# Altium schematic symbol library lib_datalogger.SchLib: 1246 symbols (part 11 of 16) (continued)
## CMP-018-000010-1 (continued)
RES 180 OHM 1/8W 5% 0805 SMD; Manufacturer Part Number: ERJ-6GEYJ181V; Power (Watts): 0.125W, 1/8W; Resistance (Ohms): 180; Temperature Coefficient: ±200ppm/°C; RoHS: RoHS Compliant; Source: mits.SchLib; Operating Temperature: -55°C ~ 155°C; ComponentLink1URL: http://industrial.panasonic.com/www-cgi/jvcr13pz.cgi?E+PZ+3+AOA0001+ERJ6GEYJ181V+7+WW; Stock 1: 114196; Part Status: Active; Pricing 1: 1=0.1, 10=0.025, 25=0.018, 50=0.0136, 100=0.01, 250=0.00764, 500=0.00612, 1000=0.00451 (USD); Category: Resistors; Height - Seated (Max): 0.028" (0.70mm); Design Item ID: RES 180R 1/8W 5% 0805 SMD; Failure Rate: -; ComponentLink1Description: http://industrial.panasonic.com/www-cgi/jvcr13pz.cgi?E+PZ+3+AOA0001+ERJ6GEYJ181V+7+WW; Supplier Device Package: 0805; Size / Dimension: 0.079" L x 0.049" W (2.00mm x 1.25mm); Package / Case: 0805 (2012 Metric); Features: Automotive AEC-Q200
footprint CR1608-0603 (Chip Resistor; Body 1.6 x 0.8 mm (LxW typ))
footprint CR2012-0805 (Chip Capacitor)
pins: 1, 2

## CMP-018-000011-1
designator R?, comment RES 1k5 1/10W 1% 0402 SMD  Manufacturer: Panasonic Electronic Components
RES SMD 1.5K OHM 1% 1/10W 0402; Part#: ERJ-2RKF1501X; eVendor#: P1.50KLCT-ND; eVendor: Digi-Key; eVendorPrice: 0,10; MSRP: 0,00383; Datasheet: http://industrial.panasonic.com/www-cgi/jvcr13pz.cgi?E+PZ+3+AOA0002+ERJ2RKF1501X+7+WW; Design Item ID: RES 1k5 1/10W 1% 0402 SMD; MOQ: 5000; Source: mits.SchLib
footprint CR1608-0603 (Chip Resistor; Body 1.6 x 0.8 mm (LxW typ))
footprint CR1005-0402
pins: 1, 2

## CMP-018-000013-1
designator CON?, comment RES 270R 1% 1/8W 0805 SMD  Composition: Thick Film  Manufacturer: Yageo  Tolerance: ±1%  Packaging: Cut Tape (CT)
RES SMD 270 OHM 1% 1/8W 0805; Manufacturer Part Number: RC0805FR-07270RL; Resistance (Ohms): 270; Temperature Coefficient: ±100ppm/°C; Power (Watts): 0.125W, 1/8W; Stock 1: 182204; RoHS: RoHS Compliant; Source: mits.SchLib; Package / Case: 0805 (2012 Metric); Design Item ID: RES 270R 1% 1/8W 0805 SMD; Number of Terminations: 2; Size / Dimension: 0.079" L x 0.049" W (2.00mm x 1.25mm); Supplier Device Package: 0805; ComponentLink1URL: http://www.yageo.com/documents/recent/PYu-RC_Group_51_RoHS_L_04.pdf; Operating Temperature: -55°C ~ 155°C; Category: Resistors; ComponentLink1Description: http://www.yageo.com/documents/recent/PYu-RC_Group_51_RoHS_L_04.pdf; Features: Moisture Resistant; Height: 0.024" (0.60mm); Pricing 1: 1=0.1, 10=0.021, 25=0.0152, 100=0.0084, 250=0.00644, 500=0.00514, 1000=0.00379, 2500=0.00329 (USD)
footprint CR2012-0805 (Chip Capacitor)
pins: 1, 2, 3, 4, 5, 6

## CMP-018-000014-1
designator R?, comment RES 270R 5% 1/4W 1206 SMD  Tolerance: ±5%  Composition: Thick Film  Manufacturer: Panasonic Electronic Components  Packaging: Cut Tape (CT)
RES SMD 270 OHM 5% 1/4W 1206; Manufacturer Part Number: ERJ-8GEYJ271V; Resistance (Ohms): 270; Power (Watts): 0.25W, 1/4W; Temperature Coefficient: ±200ppm/°C; Supplier Device Package: 1206; Number of Terminations: 2; Height: 0.028" (0.70mm); Design Item ID: RES 270R 5% 1/4W 1206 SMD; ComponentLink1URL: http://industrial.panasonic.com/www-cgi/jvcr13pz.cgi?E+PZ+3+AOA0001+ERJ8GEYJ271V+7+WW; Pricing 1: 1=0.1, 50=0.0212, 100=0.0156, 250=0.01188, 500=0.0095, 1000=0.007 (USD); Part Status: Active; RoHS: RoHS Compliant; Package / Case: 1206 (3216 Metric); Stock 1: 108729; Category: Resistors; Source: mits.SchLib; Size / Dimension: 0.126" L x 0.063" W (3.20mm x 1.60mm); Operating Temperature: -55°C ~ 155°C; Features: Automotive AEC-Q200; ComponentLink1Description: http://industrial.panasonic.com/www-cgi/jvcr13pz.cgi?E+PZ+3+AOA0001+ERJ8GEYJ271V+7+WW
footprint CR1608-0603 (Chip Resistor; Body 1.6 x 0.8 mm (LxW typ))
footprint CR3216-1206 (Chip Capacitor; Body 3.2 x 1.6 mm (LxW typ))
pins: 1, 2

## CMP-018-000015-2
designator R?, comment RES 2K7 OHM 1% 1/10W 0603  Composition: Thick Film  Packaging: Cut Tape (CT)  Tolerance: ±1%  Manufacturer: Yageo
RES SMD 2.7K OHM 1% 1/10W 0603; Manufacturer Part Number: RC0603FR-072K7L; Power (Watts): 0.1W, 1/10W; Temperature Coefficient: ±100ppm/°C; Source: mits.SchLib; Stock 1: 192813; Part Status: Active; Features: Moisture Resistant; RoHS: RoHS Compliant; ComponentLink1URL: http://www.yageo.com/NewPortal/yageodocoutput?fileName=/pdf/R-Chip/PYu-RC_Group_51_RoHS_L_4.pdf; Height - Seated (Max): 0.022" (0.55mm); Pricing 1: 1=0.1, 10=0.013, 25=0.0092, 50=0.007, 100=0.0052, 250=0.00396, 500=0.00316, 1000=0.00233 (USD); Failure Rate: -; Supplier Device Package: 0603; Category: Resistors; Resistance (Ohms): 2.7k; Size / Dimension: 0.063" L x 0.031" W (1.60mm x 0.80mm); Number of Terminations: 2; Design Item ID: RES 2K7 OHM 1% 1/10W 0603; Package / Case: 0603 (1608 Metric); Operating Temperature: -55°C ~ 155°C; ComponentLink1Description: http://www.yageo.com/NewPortal/yageodocoutput?fileName=/pdf/R-Chip/PYu-RC_Group_51_RoHS_L_4.pdf
footprint CR1608-0603 (Chip Resistor; Body 1.6 x 0.8 mm (LxW typ))
footprint CR1608-0603 (Chip Resistor; Body 1.6 x 0.8 mm (LxW typ))
pins: 1, 2

## CMP-018-000016-1
designator R?, comment RES 330K 1% 1/8W 0805 SMD  RoHS Compliant: Yes  Manufacturer: Panasonic  Max Operating Temperature: 155°C  Case/Package: 0805  Min Operating Temperature: -55°C  Resistance: 330kR  Package Quantity: 1  Packaging: Tape and Reel  Tolerance: 1%  Voltage Rating: 150V
SMD Chip Resistor, 0805 [2012 Metric], 330 kohm, ERJ6EN Series, 150 V, Thick Film, 125 mW; Manufacturer Part Number: ERJP06F3303V; Power Rating: 500mW; Temperature Coefficient: 100ppm/°C; Max Power Dissipation: 125mW; REACH SVHC: No SVHC; ComponentLink17URL: https://datasheet.ciiva.com/17206/aoa0000ce2-17206265.pdf?src-supplier=Avnet+Europe; Military Standard: Not; Source: mits.SchLib; ComponentLink14URL: https://datasheet.ciiva.com/16761/70260748-16761642.pdf?src-supplier=Allied+Electronics; ComponentLink13Description: https://datasheet.ciiva.com/24026/aoa0000ce2-24026247.pdf?src-supplier=Mouser; ComponentLink2Description: https://datasheet.ciiva.com/5915/1674679-5915439.pdf?src-supplier=Farnell; ComponentLink6URL: https://datasheet.ciiva.com/11821/0900766b80f80784-11821637.pdf?src-supplier=RSComponents; Stock 1: 4880; ComponentLink7URL: https://datasheet.ciiva.com/5915/426256-5915341.pdf?src-supplier=Farnell; Pricing 2: 1=0,10000, 10=0,07500, 100=0,02880, 1000=0,01265, 2500=0,01092 (USD); Series: ERJ-P06; Resistance Tolerance: 1%; Length: 2mm; ComponentLink15Description: https://datasheet.ciiva.com/16765/70260748-16765294.pdf?src-supplier=Allied+Electronics; ComponentLink16URL: https://datasheet.ciiva.com/9183/aoa0000ce2-9183029.pdf?src-supplier=Avnet; Width: 1.2mm; ComponentLink14Description: https://datasheet.ciiva.com/16761/70260748-16761642.pdf?src-supplier=Allied+Electronics; ComponentLink6Description: https://datasheet.ciiva.com/11821/0900766b80f80784-11821637.pdf?src-supplier=RSComponents; ComponentLink15URL: https://datasheet.ciiva.com/16765/70260748-16765294.pdf?src-supplier=Allied+Electronics; Category: Chip SMD Resistors; ComponentLink12URL: https://datasheet.ciiva.com/46420/1678782-46420183.pdf?src-supplier=Element14; ComponentLink7Description: https://datasheet.ciiva.com/5915/426256-5915341.pdf?src-supplier=Farnell; ComponentLink9URL: https://datasheet.ciiva.com/7836/426256-7836824.pdf?src-supplier=Element14; Case Code (Metric): 2012; Pricing 1: 10=0,05250, 100=0,04060, 300=0,03840, 1000=0,03620, 5000=0,03530, 10000=0,03480, 10=0,05070, 100=0,03920, 300=0,03710, 1000=0,03500, 5000=0,03410, 10000=0,03360, 10=0,26530, 100=0,20500, 300=0,19400, 1000=0,18290, 5000=0,17840, 10000=0,17580, 10=0,25190, 100=0,19460, 300=0,18420, 1000=0,17370, 5000=0,16940, 10000=0,16690, 10=0,03390, 100=0,02620, 300=0,02480, 1000=0,02340, 5000=0,02280, 10000=0,02240, 10=0,02940, 100=0,02280, 300=0,02150, 1000=0,02030, 5000=0,01980, 10000=0,01950, 10=0,31740, 100=0,24530, 300=0,23210, 1000=0,21890, 5000=0,21340, 10000=0,21030, 10=4,42890, 100=3,42180, 300=3,23770, 1000=3,05360, 5000=2,97780, 10000=2,93450, 10=0,16760, 100=0,12950, 300=0,12260, 1000=0,11560, 5000=0,11270, 10000=0,11110, 10=3,06680, 100=2,36940, 300=2,24200, 1000=2,11450, 5000=2,06200, 10000=2,03200, 10=0,34300, 100=0,26500, 300=0,25080, 1000=0,23650, 5000=0,23060, 10000=0,22730, 10=0,05430, 100=0,04190, 300=0,03970, 1000=0,03740, 5000=0,03650, 10000=0,03590, 10=0,04090, 100=0,03160, 300=0,02990, 1000=0,02820, 5000=0,02750, 10000=0,02710 (AUD); Height: 0.6mm; ComponentLink12Description: https://datasheet.ciiva.com/46420/1678782-46420183.pdf?src-supplier=Element14; Design Item ID: RES 330K 1% 1/8W 0805 SMD; ComponentLink4Description: https://datasheet.ciiva.com/17206/aoa0000ce4-17206277.pdf?src-supplier=Avnet+Europe; ComponentLink3URL: https://datasheet.ciiva.com/24160/aoa0000ce4-64075-24160351.pdf?src-supplier=Mouser; ComponentLink10URL: https://datasheet.ciiva.com/22673/1678782-22673294.pdf?src-supplier=Element14; ComponentLink8Description: https://datasheet.ciiva.com/7836/426256-7836539.pdf?src-supplier=Element14; Weight: 0.000194oz; ComponentLink1URL: https://datasheet.ciiva.com/11817/0900766b812cb812-11817202.pdf?src-supplier=RSComponents; Contact Plating: Tin; ComponentLink3Description: https://datasheet.ciiva.com/24160/aoa0000ce4-64075-24160351.pdf?src-supplier=Mouser; RoHS: Yes; Technology: THICK FILM; ComponentLink16Description: https://datasheet.ciiva.com/9183/aoa0000ce2-9183029.pdf?src-supplier=Avnet; ComponentLink8URL: https://datasheet.ciiva.com/7836/426256-7836539.pdf?src-supplier=Element14; ComponentLink2URL: https://datasheet.ciiva.com/5915/1674679-5915439.pdf?src-supplier=Farnell; Stock 2: 35692; ComponentLink13URL: https://datasheet.ciiva.com/24026/aoa0000ce2-24026247.pdf?src-supplier=Mouser; Stock 3: 48300; ComponentLink4URL: https://datasheet.ciiva.com/17206/aoa0000ce4-17206277.pdf?src-supplier=Avnet+Europe; ComponentLink1Description: https://datasheet.ciiva.com/11817/0900766b812cb812-11817202.pdf?src-supplier=RSComponents; Construction: Rectangular; Number of Terminations: 2; Resistor Type: Thick Film; ComponentLink5URL: https://datasheet.ciiva.com/48426/erjp-series-eng-tds-48426811.pdf?src-supplier=Distrelec; ComponentLink17Description: https://datasheet.ciiva.com/17206/aoa0000ce2-17206265.pdf?src-supplier=Avnet+Europe; ComponentLink10Description: https://datasheet.ciiva.com/22673/1678782-22673294.pdf?src-supplier=Element14; Voltage Rating (DC): 150V; ComponentLink11Description: https://datasheet.ciiva.com/22687/1678782-22687438.pdf?src-supplier=Element14; Features: Automotive AEC-Q200; Radiation Hardening: No; Pricing 3: 100=0,00450, 1000=0,00350, 3000=0,00320, 10000=0,00310, 50000=0,00300, 100000=0,00300, 100=0,00430, 1000=0,00330, 3000=0,00310, 10000=0,00300, 50000=0,00290, 100000=0,00290, 100=0,02270, 1000=0,01750, 3000=0,01620, 10000=0,01560, 50000=0,01490, 100000=0,01490, 100=0,02160, 1000=0,01660, 3000=0,01540, 10000=0,01480, 50000=0,01420, 100000=0,01420, 100=0,00290, 1000=0,00220, 3000=0,00210, 10000=0,00200, 50000=0,00190, 100000=0,00190, 100=0,00250, 1000=0,00190, 3000=0,00180, 10000=0,00170, 50000=0,00170, 100000=0,00170, 100=0,02720, 1000=0,02100, 3000=0,01940, 10000=0,01860, 50000=0,01790, 100000=0,01790, 100=0,37900, 1000=0,29240, 3000=0,27070, 10000=0,25990, 50000=0,24910, 100000=0,24910, 100=0,01430, 1000=0,01110, 3000=0,01020, 10000=0,00980, 50000=0,00940, 100000=0,00940, 100=0,26240, 1000=0,20250, 3000=0,18750, 10000=0,18000, 50000=0,17250, 100000=0,17250, 100=0,02940, 1000=0,02260, 3000=0,02100, 10000=0,02010, 50000=0,01930, 100000=0,01930, 100=0,00460, 1000=0,00360, 3000=0,00330, 10000=0,00320, 50000=0,00310, 100000=0,00310, 100=0,00350, 1000=0,00270, 3000=0,00250, 10000=0,00240, 50000=0,00230, 100000=0,00230 (AUD); Mount: Surface Mount; ComponentLink9Description: https://datasheet.ciiva.com/7836/426256-7836824.pdf?src-supplier=Element14; ComponentLink11URL: https://datasheet.ciiva.com/22687/1678782-22687438.pdf?src-supplier=Element14; Case Code (Imperial): 0805; Termination: SMD/SMT; Number of Pins: 2; Depth: 1.25mm; ComponentLink5Description: https://datasheet.ciiva.com/48426/erjp-series-eng-tds-48426811.pdf?src-supplier=Distrelec
footprint CR1608-0603 (Chip Resistor; Body 1.6 x 0.8 mm (LxW typ))
footprint CR2012-0805 (Chip Capacitor)
pins: 1, 2

## CMP-018-000017-1
designator R?, comment RES 49R9 1/4W 1% 1206 SMD  Packaging: Cut Tape (CT)  Manufacturer: Panasonic Electronic Components  Tolerance: ±1%  Composition: Thick Film
RES SMD 49.9 OHM 1% 1/4W 1206; Manufacturer Part Number: ERJ-8ENF49R9V; Resistance (Ohms): 49.9; Temperature Coefficient: ±100ppm/°C; Power (Watts): 0.25W, 1/4W; Height - Seated (Max): 0.028" (0.70mm); Source: mits.SchLib; Stock 1: 252764; ComponentLink1Description: https://industrial.panasonic.com/cdbs/www-data/pdf/RDA0000/AOA0000C283.pdf; Operating Temperature: -55°C ~ 155°C; Features: Automotive AEC-Q200; Supplier Device Package: 1206; RoHS: RoHS Compliant; ComponentLink1URL: https://industrial.panasonic.com/cdbs/www-data/pdf/RDA0000/AOA0000C283.pdf; Size / Dimension: 0.126" L x 0.063" W (3.20mm x 1.60mm); Package / Case: 1206 (3216 Metric); Number of Terminations: 2; Pricing 1: 1=0.1, 10=0.046, 25=0.0336, 50=0.0256, 100=0.0189, 250=0.0144, 500=0.01152, 1000=0.00848 (USD); Failure Rate: -; Design Item ID: RES 49R9 1/4W 1% 1206 SMD; Category: Resistors; Part Status: Active
footprint CR1608-0603 (Chip Resistor; Body 1.6 x 0.8 mm (LxW typ))
footprint CR3216-1206 (Chip Capacitor; Body 3.2 x 1.6 mm (LxW typ))
pins: 1, 2

## CMP-018-000018-1
designator R?, comment RES 4K7 0.25W 5% 0603 SMD  Resistance: 4.7kR  Case/Package: 0603  Max Operating Temperature: 155°C  Voltage Rating: 75V  Packaging: Tape and Reel  Package Quantity: 1  Tolerance: 5%  Min Operating Temperature: -55°C  RoHS Compliant: Yes
RES SMD 4.7K OHM 5% 0.25W 0603; Max Power Dissipation: 250mW; Voltage Rating (DC): 50V; Temperature Coefficient: 200ppm/°C; Number of Terminations: 2; Category: Chip SMD Resistors; ComponentLink7Description: https://datasheet.ciiva.com/26179/chip-resistor-150112-1-26179192.pdf?src-supplier=Digi-Key; Construction: Rectangular; ComponentLink4URL: https://datasheet.ciiva.com/2472/crcwhpe3-2472117.pdf?src-supplier=Digi-Key; Stock 1: 26974; Weight: 7.1E-05oz; Series: CRCW-HP; Radiation Hardening: No; Lead Free: Lead Free; ComponentLink2Description: https://datasheet.ciiva.com/5544/crcwhpe3-46056-5544495.pdf?src-supplier=Mouser; Case Code (Metric): 1608; Design Item ID: RES 4K7 0.25W 5% 0603 SMD; ComponentLink6Description: https://datasheet.ciiva.com/2472/crcwhpe3-2472119.pdf?src-supplier=Digi-Key; Pricing 1: 1=0,16000, 10=0,13500, 100=0,05290, 1000=0,02215, 2500=0,02030 (USD); ComponentLink3Description: https://datasheet.ciiva.com/9071/crcwhpe3-9071355.pdf?src-supplier=Avnet; Stock 2: 165000; ComponentLink9URL: https://datasheet.ciiva.com/26179/chip-resistor-150112-1-26179209.pdf?src-supplier=Digi-Key; ComponentLink1URL: https://datasheet.ciiva.com/48527/crcwhpe3-48527015.pdf?src-supplier=Avnet; Height: 0.022inch; ComponentLink4Description: https://datasheet.ciiva.com/2472/crcwhpe3-2472117.pdf?src-supplier=Digi-Key; Width: 0.033inch; Features: Automotive AEC-Q200; Contact Plating: Tin; ComponentLink5URL: https://datasheet.ciiva.com/2472/crcwhpe3-2472118.pdf?src-supplier=Digi-Key; ComponentLink1Description: https://datasheet.ciiva.com/48527/crcwhpe3-48527015.pdf?src-supplier=Avnet; ComponentLink5Description: https://datasheet.ciiva.com/2472/crcwhpe3-2472118.pdf?src-supplier=Digi-Key; ComponentLink6URL: https://datasheet.ciiva.com/2472/crcwhpe3-2472119.pdf?src-supplier=Digi-Key; ComponentLink2URL: https://datasheet.ciiva.com/5544/crcwhpe3-46056-5544495.pdf?src-supplier=Mouser; Case Code (Imperial): 0603; ComponentLink3URL: https://datasheet.ciiva.com/9071/crcwhpe3-9071355.pdf?src-supplier=Avnet; ComponentLink7URL: https://datasheet.ciiva.com/26179/chip-resistor-150112-1-26179192.pdf?src-supplier=Digi-Key; Resistor Type: Thick Film; Power Rating: 250mW; Military Standard: Not; Depth: 0.8mm; Source: mits.SchLib; ComponentLink9Description: https://datasheet.ciiva.com/26179/chip-resistor-150112-1-26179209.pdf?src-supplier=Digi-Key; ComponentLink8Description: https://datasheet.ciiva.com/26179/chip-resistor-150112-1-26179179.pdf?src-supplier=Digi-Key; Pricing 2: 5000=0,01114 (USD); ComponentLink8URL: https://datasheet.ciiva.com/26179/chip-resistor-150112-1-26179179.pdf?src-supplier=Digi-Key; Length: 0.063inch
footprint CR1608-0603 (Chip Resistor; Body 1.6 x 0.8 mm (LxW typ))
footprint CR1608-0603 (Chip Resistor; Body 1.6 x 0.8 mm (LxW typ))
pins: 1, 2

## CMP-018-000019-1
designator R?, comment RES 120R 5% 1/10W 0603 SMD  Packaging: Cut Tape (CT)  Composition: Thick Film  Manufacturer: Yageo  Tolerance: ±5%
RES SMD 120 OHM 5% 1/10W 0603; Manufacturer Part Number: RC0603JR-07120RL; Power (Watts): 0.1W, 1/10W; Temperature Coefficient: ±100ppm/°C; Resistance (Ohms): 120; Number of Terminations: 2; Package / Case: 0603 (1608 Metric); Failure Rate: -; RoHS: RoHS Compliant; Pricing 1: 1=0.1, 10=0.01, 25=0.0072, 50=0.0054, 100=0.004, 250=0.00308, 500=0.00244, 1000=0.0018 (USD); ComponentLink1Description: http://www.yageo.com/NewPortal/yageodocoutput?fileName=/pdf/R-Chip/PYu-RC_Group_51_RoHS_L_4.pdf; Size / Dimension: 0.063" L x 0.031" W (1.60mm x 0.80mm); ComponentLink1URL: http://www.yageo.com/NewPortal/yageodocoutput?fileName=/pdf/R-Chip/PYu-RC_Group_51_RoHS_L_4.pdf; Features: Moisture Resistant; Stock 1: 753960; Operating Temperature: -55°C ~ 155°C; Part Status: Active; Category: Resistors; Supplier Device Package: 0603; Source: mits.SchLib; Design Item ID: RES 120R 5% 1/10W 0603 SMD; Height - Seated (Max): 0.022" (0.55mm)
footprint CR1608-0603 (Chip Resistor; Body 1.6 x 0.8 mm (LxW typ))
footprint CR1608-0603 (Chip Resistor; Body 1.6 x 0.8 mm (LxW typ))
pins: 1, 2

## CMP-018-000020-1
designator R?, comment RES 27K 1% 1/8W 0805 SMD_1  Manufacturer: KOA Speer  Composition: Thick Film  Max Operating Temperature: 155°C  Packaging: Tape and Reel  Min Operating Temperature: -55°C  Resistance: 27kR  Case/Package: 0805  Package Quantity: 5000  Voltage Rating: 150V  Tolerance: 1%
RES SMD 27K OHM 1% 1/8W 0805; Manufacturer Part Number: RK73H2ATTD2702F; Temperature Coefficient: 100ppm/°C; Power Rating: 125mW; Case Code (Metric): 2012; ComponentLink2URL: https://datasheet.ciiva.com/7866/549017-7866749.pdf?src-supplier=Element14; ComponentLink1Description: http://www.yageo.com/documents/recent/PYu-RC_Group_51_RoHS_L_04.pdf; Military Standard: Not; Pricing 1: 1=0,10000, 10=0,03300, 100=0,01360, 1000=0,00612, 2500=0,00531 (USD); Source: mits.SchLib; Design Item ID: RES 27K 1% 1/8W 0805 SMD_1; Length: 2mm; Lead Free: Lead Free; Depth: 1.25mm; RoHS: Yes; ComponentLink2Description: https://datasheet.ciiva.com/7866/549017-7866749.pdf?src-supplier=Element14; Height: 0.5mm; Stock 1: 25750; Case Code (Imperial): 0805; Category: Chip SMD Resistors; Width: 1.25mm; Number of Pins: 2; Termination: SMD/SMT; ComponentLink1URL: http://www.yageo.com/documents/recent/PYu-RC_Group_51_RoHS_L_04.pdf
footprint CR1608-0603 (Chip Resistor; Body 1.6 x 0.8 mm (LxW typ))
footprint CR2012-0805 (Chip Capacitor)
pins: 1, 2

## CMP-018-000021-1
designator R?, comment RES 2K OHM 0.1% 1/10W 0603  Case/Package: 0603  Min Operating Temperature: -55°C  Voltage Rating: 75V  Packaging: Tape and Reel  Tolerance: 0.1%  Manufacturer: Panasonic  Package Quantity: 5000  Resistance: 2kR  RoHS Compliant: Yes  Max Operating Temperature: 155°C
PANASONIC  2 kohm, 100 mW, -  0.1%, 75 V RoHS Compliant: Yes; Manufacturer Part Number: ERA-3AEB202V; Power Rating: 100mW; Temperature Coefficient: 25ppm/°C; Resistance Tolerance: 0.1%; Voltage Rating (DC): 75V; Depth: 0.8mm; Technology: THIN FILM; ComponentLink5Description: https://datasheet.ciiva.com/16764/70068849-16764889.pdf?src-supplier=Allied+Electronics; Case Code (Metric): 1608; Construction: Rectangular; ComponentLink4URL: https://datasheet.ciiva.com/5999/1776116-5999065.pdf?src-supplier=Farnell; ComponentLink1Description: https://datasheet.ciiva.com/29183/450879-da-01-en-widerstand-0603-era-29183770.pdf?src-supplier=Conrad; Pricing 1: 5=0,10410, 50=0,07860, 150=0,07390, 500=0,06920, 2500=0,06710, 5000=0,06610, 5=0,10020, 50=0,07570, 150=0,07110, 500=0,06660, 2500=0,06460, 5000=0,06360, 5=0,52300, 50=0,39490, 150=0,37120, 500=0,34760, 2500=0,33710, 5000=0,33180, 5=0,50280, 50=0,37960, 150=0,35690, 500=0,33410, 2500=0,32400, 5000=0,31900, 5=0,06760, 50=0,05100, 150=0,04800, 500=0,04490, 2500=0,04360, 5000=0,04290, 5=0,05780, 50=0,04360, 150=0,04100, 500=0,03840, 2500=0,03720, 5000=0,03670, 5=0,61880, 50=0,46720, 150=0,43920, 500=0,41120, 2500=0,39880, 5000=0,39260, 5=8,74530, 50=6,60290, 150=6,20740, 500=5,81190, 2500=5,63610, 5000=5,54820, 5=0,32990, 50=0,24910, 150=0,23410, 500=0,21920, 2500=0,21260, 5000=0,20930, 5=6,02180, 50=4,54660, 150=4,27430, 500=4,00190, 2500=3,88090, 5000=3,82030, 5=0,69130, 50=0,52190, 150=0,49070, 500=0,45940, 2500=0,44550, 5000=0,43860, 5=0,10730, 50=0,08100, 150=0,07620, 500=0,07130, 2500=0,06920, 5000=0,06810, 5=0,07960, 50=0,06010, 150=0,05650, 500=0,05290, 2500=0,05130, 5000=0,05050 (AUD); ComponentLink1URL: https://datasheet.ciiva.com/29183/450879-da-01-en-widerstand-0603-era-29183770.pdf?src-supplier=Conrad; ComponentLink8Description: https://datasheet.ciiva.com/5999/485442-5999066.pdf?src-supplier=Farnell; ComponentLink2Description: https://datasheet.ciiva.com/43455/1776116-43455368.pdf?src-supplier=Farnell; Stock 1: 16640; ComponentLink5URL: https://datasheet.ciiva.com/16764/70068849-16764889.pdf?src-supplier=Allied+Electronics; REACH SVHC: No SVHC; Military Standard: Not; Length: 1.6mm; ComponentLink3Description: https://datasheet.ciiva.com/46422/1776116-46422600.pdf?src-supplier=Element14; Termination: SMD/SMT; ComponentLink6Description: https://datasheet.ciiva.com/16771/70068849-16771321.pdf?src-supplier=Allied+Electronics; ComponentLink4Description: https://datasheet.ciiva.com/5999/1776116-5999065.pdf?src-supplier=Farnell; ComponentLink6URL: https://datasheet.ciiva.com/16771/70068849-16771321.pdf?src-supplier=Allied+Electronics; Lead Free: Lead Free; Design Item ID: RES 2K OHM 0.1% 1/10W 0603; Max Power Dissipation: 100mW; Number of Terminations: 2; Number of Pins: 2; Resistor Type: Thin Film; Case Code (Imperial): 0603; Mount: Surface Mount; Working Voltage: 75V; Contact Plating: Tin; ComponentLink2URL: https://datasheet.ciiva.com/43455/1776116-43455368.pdf?src-supplier=Farnell; ComponentLink3URL: https://datasheet.ciiva.com/46422/1776116-46422600.pdf?src-supplier=Element14; ComponentLink8URL: https://datasheet.ciiva.com/5999/485442-5999066.pdf?src-supplier=Farnell; Category: Chip SMD Resistors; ComponentLink7Description: https://datasheet.ciiva.com/46422/1776116-46422601.pdf?src-supplier=Element14; Height: 0.45mm; Series: ERA-3A; Width: 0.8mm; Source: mits.SchLib; RoHS: Yes; Radiation Hardening: No; ComponentLink7URL: https://datasheet.ciiva.com/46422/1776116-46422601.pdf?src-supplier=Element14
footprint CR1608-0603 (Chip Resistor; Body 1.6 x 0.8 mm (LxW typ))
footprint CR1608-0603 (Chip Resistor; Body 1.6 x 0.8 mm (LxW typ))
pins: 1, 2

## CMP-018-000023-1
designator R?, comment RES 4K87 1% 1/10W 0402 SMD  Manufacturer: Panasonic Electronic Components
RES SMD 4.87K OHM 1% 1/10W 0402; Part#: ERJ-2RKF4871X; eVendor: Digi-Key; eVendor#: P4.87KLCT-ND; eVendorPrice: 0,10; MSRP: 0,00383; MOQ: 5000; Datasheet: http://industrial.panasonic.com/www-cgi/jvcr13pz.cgi?E+PZ+3+AOA0002+ERJ2RKF4871X+7+WW; Source: mits.SchLib; Design Item ID: RES 4K87 1% 1/10W 0402 SMD
footprint CR3216-1206 (Chip Capacitor; Body 3.2 x 1.6 mm (LxW typ))
footprint CR1005-0402
pins: 1, 2

## CMP-018-000024-1
designator R?, comment RES 806R 1/10W 1% 0603 SMD  Manufacturer: Yageo
RES SMD 806 OHM 1% 1/10W 0603; Part#: RC0603FR-07806RL; eVendor: Digi-Key; MSRP: 0,00223; eVendor#: 311-806HRCT-ND; eVendorPrice: 0,10; MOQ: 2500; Datasheet: http://www.yageo.com.tw/exep/pages/download/literatures/PYu-R_INT-thick_7.pdf; Source: mits.SchLib; Design Item ID: RES 806R 1/10W 1% 0603 SMD
footprint CR1608-0603 (Chip Resistor; Body 1.6 x 0.8 mm (LxW typ))
footprint CR1608-0603 (Chip Resistor; Body 1.6 x 0.8 mm (LxW typ))
pins: 1, 2
text: 1%

## CMP-018-000025-1
designator R?, comment RES 10R OHM 5% 6W TRUE HOLE  Tolerance: 5%  Packaging: Cut Tape (CT)  Composition: Metal Film
10Ω ±5% 6W AXIAL WIREWOUND RESISTORS ROHS; Manufeacturer: Resistor.Today; Manufeacturer Part Number: EWWR0006J10R0T9; Resistance (Ohms): 10; ComponentLink1URL: https://datasheet.lcsc.com/szlcsc/1811131131_CCO-Chian-Chia-Elec-MF3WS-7-5R-1-T_C119686.pdf; Design Item ID: RES 10R OHM 5% 6W TRUE HOLE; RoHS: RoHS Compliant; Power (Watts): 6W; Source: mits.SchLib; ComponentLink1Description: datasheet; Part Status: Active; Supplier Device Package: Axial; Features: Resistor; Category: Resistors; Package / Case: Axial
footprint CR1608-0603 (Chip Resistor; Body 1.6 x 0.8 mm (LxW typ))
footprint RES TRUE_HOLE
pins: 1, 2

## CMP-018-000026-1
designator R?, comment RES 1K OHM 1% 1/8W 0805 SMD  Resistance: 1kR  Case/Package: 0805  Tolerance: 1%  Voltage Rating: 150V  Package Quantity: 1  Min Operating Temperature: -55°C  Composition: Thick Film  Max Operating Temperature: 155°C  Packaging: Tape and Reel  Manufacturer: Yageo
RES SMD 1K OHM 1% 1/8W 0805; Manufacturer Part Number: RC0805FR-071KL; Temperature Coefficient: 100ppm/°C; Power Rating: 125mW; Pricing 1: 1=0,10000, 10=0,04000, 100=0,01630, 1000=0,00731, 2500=0,00635 (USD); ComponentLink2URL: https://datasheet.ciiva.com/2456/pyu-r-int-thick-7-2456976.pdf?src-supplier=Digi-Key; ComponentLink2Description: https://datasheet.ciiva.com/2456/pyu-r-int-thick-7-2456976.pdf?src-supplier=Digi-Key; RoHS: Yes; Category: Chip SMD Resistors; ComponentLink1Description: http://media.digikey.com/pdf/Data%20Sheets/Rohm%20PDFs/MCR10%20(new)%20series.pdf; ComponentLink6URL: https://datasheet.ciiva.com/46385/444164-46385020.pdf?src-supplier=Element14; Design Item ID: RES 1K OHM 1% 1/8W 0805 SMD; Number of Pins: 2; Stock 1: 24108233; Termination: SMD/SMT; Height: 0.024inch; REACH SVHC: Unknown; Military Standard: Not; Number of Terminations: 2; ComponentLink5URL: https://datasheet.ciiva.com/16850/rc0805-16850409.pdf?src-supplier=Future+Electronics; Lead Free: Lead Free; Case Code (Metric): 2012; ComponentLink3Description: https://datasheet.ciiva.com/2456/pyu-r-int-thick-7-2456977.pdf?src-supplier=Digi-Key; ComponentLink4Description: https://datasheet.ciiva.com/7941/1686128-7941719.pdf?src-supplier=Element14; ComponentLink3URL: https://datasheet.ciiva.com/2456/pyu-r-int-thick-7-2456977.pdf?src-supplier=Digi-Key; Voltage Rating (DC): 150V; ComponentLink5Description: https://datasheet.ciiva.com/16850/rc0805-16850409.pdf?src-supplier=Future+Electronics; ComponentLink7URL: https://datasheet.ciiva.com/2456/pyu-r-int-thick-7-2456975.pdf?src-supplier=Digi-Key; ComponentLink4URL: https://datasheet.ciiva.com/7941/1686128-7941719.pdf?src-supplier=Element14; Source: mits.SchLib; ComponentLink7Description: https://datasheet.ciiva.com/2456/pyu-r-int-thick-7-2456975.pdf?src-supplier=Digi-Key; Max Power Dissipation: 125mW; ComponentLink6Description: https://datasheet.ciiva.com/46385/444164-46385020.pdf?src-supplier=Element14; Case Code (Imperial): 0805; Length: 0.079inch; Depth: 1.25mm; Width: 0.049inch; ComponentLink1URL: http://media.digikey.com/pdf/Data%20Sheets/Rohm%20PDFs/MCR10%20(new)%20series.pdf; Features: Moisture Resistant
footprint CR1608-0603 (Chip Resistor; Body 1.6 x 0.8 mm (LxW typ))
footprint CR2012-0805 (Chip Capacitor)
pins: 1, 2

## CMP-018-000027-2
designator R?, comment RES 1K OHM 1/4W 1% SMD 0603  Tolerance: ±1%  Composition: Thin Film  Packaging: Cut Tape (CT)
RES SMD 1K OHM 1% 1/4W 0603; Manufacturer 1: Panasonic; Manufacturer Part Number 1: ERJ-PA3F1001V; Power (Watts): 0.125W, 1/8W; Temperature Coefficient: ±50ppm/°C; Design Item ID: RES 1K OHM 1/8W 1% SMD 0603; RoHS: RoHS Compliant; Features: -; Size / Dimension: 0.061" L x 0.033" W (1.55mm x 0.85mm); Stock 1: 41559; Manufacturer Part Number 2: MCT06030C1001FP500; Package / Case: 0603 (1608 Metric); Height: 0.022" (0.55mm); Source: mits.SchLib; Supplier Device Package: 0603; Number of Terminations: 2; Manufacturer 2: Vishay Beyschlag; ComponentLink1URL: http://www.vishay.com/docs/28705/mcx0x0xpro.pdf; Operating Temperature: -55°C ~ 155°C; Pricing 1: 1=0.17, 10=0.145, 25=0.1056, 50=0.0766, 100=0.0568, 250=0.04356, 500=0.03432, 1000=0.02376, 2500=0.02178 (USD); Category: Resistors; Resistance (Ohms): 1k; ComponentLink1Description: http://www.vishay.com/docs/28705/mcx0x0xpro.pdf
footprint CR1608-0603 (Chip Resistor; Body 1.6 x 0.8 mm (LxW typ))
footprint CR1608-0603 (Chip Resistor; Body 1.6 x 0.8 mm (LxW typ))
pins: 1, 2

## CMP-018-000028-4
designator R?, comment RES 5K OHM 1% 1/8W 0805 SMD  Voltage Rating: 150V  Packaging: Tape and Reel  Manufacturer: Vishay Dale  Package Quantity: 5000  Min Operating Temperature: -55°C  Resistance: 5kR  Tolerance: 1%  Composition: Thick Film  Max Operating Temperature: 155°C  Case/Package: 0805
Manufacturer Part Number: CRCW08055K00FKTA; Power Rating: 125mW; Temperature Coefficient: 100ppm/°C; Features: Automotive AEC-Q200; Voltage Rating (DC): 150V; Stock 3: 7440; Number of Pins: 2; Number of Terminations: 2; ComponentLink5URL: https://datasheet.ciiva.com/22692/886349-22692838.pdf?src-supplier=Element14; ComponentLink1URL: https://datasheet.ciiva.com/7112/1747955-7112385.pdf?src-supplier=Newark; ComponentLink2Description: https://datasheet.ciiva.com/9069/dcrcw-9069004.pdf?src-supplier=Avnet; Pricing 1: 1=0,14000, 10=0,12900, 100=0,04960, 1000=0,02182, 2500=0,01885 (USD); RoHS: Yes; ComponentLink4URL: https://datasheet.ciiva.com/2505/frsm-2505424.pdf?src-supplier=Digi-Key; ComponentLink6URL: https://datasheet.ciiva.com/7984/886349-7984655.pdf?src-supplier=Element14; Stock 1: 6926; Case Code (Metric): 2012; ComponentLink3Description: https://datasheet.ciiva.com/28561/1747955-28561708.pdf?src-supplier=Element14; Length: 0.079inch; Source: mits.SchLib; Max Power Dissipation: 125mW; REACH SVHC: Unknown; Termination: SMD/SMT; ComponentLink5Description: https://datasheet.ciiva.com/22692/886349-22692838.pdf?src-supplier=Element14; ComponentLink3URL: https://datasheet.ciiva.com/28561/1747955-28561708.pdf?src-supplier=Element14; Pricing 2: 1=27,09000, 10=23,66500 (USD); Weight: 0.000194oz; Stock 2: 174; ComponentLink1Description: https://datasheet.ciiva.com/7112/1747955-7112385.pdf?src-supplier=Newark; Contact Plating: Tin,Lead; Category: Chip SMD Resistors; Case Code (Imperial): 0805; ComponentLink4Description: https://datasheet.ciiva.com/2505/frsm-2505424.pdf?src-supplier=Digi-Key; Radiation Hardening: No; ComponentLink6Description: https://datasheet.ciiva.com/7984/886349-7984655.pdf?src-supplier=Element14; ComponentLink2URL: https://datasheet.ciiva.com/9069/dcrcw-9069004.pdf?src-supplier=Avnet; Height: 0.02inch; Design Item ID: RES 5K OHM 1% 1/8W 0805 SMD; Width: 1.25mm; Lead Free: Contains Lead; Pricing 3: 1=2,63000, 10=2,32900, 100=1,77870 (USD)
footprint CR1608-0603 (Chip Resistor; Body 1.6 x 0.8 mm (LxW typ))
footprint CR2012-0805 (Chip Capacitor)
pins: 1, 2

## CMP-018-000029-1
designator R?, comment RES 0R JUMPER 1/16W 0402 SMD  Manufacturer: Multicomp
RES SMD 0.0OHM JUMPER 1/16W 0402; Part#: 0402WGF0000TCE; MSRP: 0,0004; eVendor: LCSC; eVendorPrice: 0,0012; Obs: --; Design Item ID: RES 0R JUMPER 1/16W 0402 SMD; Manufacturer Part Number: 0402WGF0000TCE; MOQ: 5000; eVendor#: 0402WGF0000TCE; Source: mits.SchLib; Datasheet: https://datasheet.lcsc.com/szlcsc/Uniroyal-Elec-0402WGF0000TCE_C17168.pdf
footprint CR1608-0603 (Chip Resistor; Body 1.6 x 0.8 mm (LxW typ))
footprint CR1005-0402
pins: 1, 2

## CMP-018-000030-1
designator R?, comment RES 10K OHM 1% 1/8W 0805 SMD
RES 0805 10K Ohm 0.1% 1/8W  SMD; Manufacturer Part Number: ERJ-6ENF1002V; Manufacturer: Panasonic Electronic Components; Power: 0.125W, 1/8W; Number of Resistors: 1; Voltage Rating (DC): 150V; Max Power Dissipation: 125mW; Temperature Coefficient: ±100ppm/°C; ComponentLink6URL: https://datasheet.ciiva.com/16725/70260748-16725031.pdf?src-supplier=Allied+Electronics; Package / Case: 0805 (2012 Metric); Supplier Device Package: 0805; Resistance (Ohms): 10k; ComponentLink14Description: https://datasheet.ciiva.com/24440/eng-ds-1773270-l-24440188.pdf?src-supplier=Onlinecomponents.com; Operating Temperature: -55°C ~ 155°C; ComponentLink15Description: https://datasheet.ciiva.com/7731/eng-ds-1773270-l-7731311.pdf?src-supplier=Element14; ComponentLink7Description: https://datasheet.ciiva.com/46372/1678782-46372714.pdf?src-supplier=Element14; ComponentLink13Description: https://datasheet.ciiva.com/16723/70063741-16723029.pdf?src-supplier=Allied+Electronics; Contact Plating: Tin; Part Status: Active; ComponentLink11Description: https://datasheet.ciiva.com/30140/aoa0000ce2-30140236.pdf?src-supplier=Onlinecomponents.com; ComponentLink6Description: https://datasheet.ciiva.com/16725/70260748-16725031.pdf?src-supplier=Allied+Electronics; Lead Free: Lead Free; ComponentLink14URL: https://datasheet.ciiva.com/24440/eng-ds-1773270-l-24440188.pdf?src-supplier=Onlinecomponents.com; Design Item ID: RES 10K OHM 1% 1/8W 0805 SMD; ComponentLink7URL: https://datasheet.ciiva.com/46372/1678782-46372714.pdf?src-supplier=Element14; ComponentLink3Description: https://datasheet.ciiva.com/16514/aoa0000ce2-16514021.pdf?src-supplier=Avnet+Asia; Category: Resistors; ComponentLink13URL: https://datasheet.ciiva.com/16723/70063741-16723029.pdf?src-supplier=Allied+Electronics; Case Code (Imperial): 0805; Failure Rate: -; Stock 1: 2392770; ComponentLink5URL: https://datasheet.ciiva.com/16759/70260748-16759350.pdf?src-supplier=Allied+Electronics; Features: Automotive AEC-Q200; ComponentLink12URL: https://datasheet.ciiva.com/24070/aoa0000ce2-24070702.pdf?src-supplier=Mouser; ComponentLink9URL: https://datasheet.ciiva.com/7830/426256-7830745.pdf?src-supplier=Element14; Termination: SMD/SMT; ComponentLink10Description: https://datasheet.ciiva.com/17212/aoa0000ce2-17212108.pdf?src-supplier=Avnet+Europe; Length: 2mm; ComponentLink15URL: https://datasheet.ciiva.com/7731/eng-ds-1773270-l-7731311.pdf?src-supplier=Element14; ComponentLink8Description: https://datasheet.ciiva.com/46372/1678782-46372715.pdf?src-supplier=Element14; ComponentLink11URL: https://datasheet.ciiva.com/30140/aoa0000ce2-30140236.pdf?src-supplier=Onlinecomponents.com; Size / Dimension: 0.079" L x 0.049" W (2.00mm x 1.25mm); ComponentLink9Description: https://datasheet.ciiva.com/7830/426256-7830745.pdf?src-supplier=Element14; REACH SVHC: No SVHC; Source: mits.SchLib; Military Standard: Not; ComponentLink5Description: https://datasheet.ciiva.com/16759/70260748-16759350.pdf?src-supplier=Allied+Electronics; ComponentLink1Description: https://industrial.panasonic.com/cdbs/www-data/pdf/RDA0000/AOA0000C283.pdf; ComponentLink16URL: https://datasheet.ciiva.com/14181/jcrn73-data-e-14181423.pdf?src-supplier=Distrelec; Stock 2: 1650; Working Voltage: 150V; ComponentLink8URL: https://datasheet.ciiva.com/46372/1678782-46372715.pdf?src-supplier=Element14; ComponentLink10URL: https://datasheet.ciiva.com/17212/aoa0000ce2-17212108.pdf?src-supplier=Avnet+Europe; Number of Pins: 2; Height: 0.6mm; ComponentLink4Description: https://datasheet.ciiva.com/27055/1988971-27055733.pdf?src-supplier=Jameco; ComponentLink4URL: https://datasheet.ciiva.com/27055/1988971-27055733.pdf?src-supplier=Jameco; Pricing 2: 1=1,68000, 10=1,48900, 100=1,13720, 1000=0,73645 (USD); Radiation Hardening: No; ComponentLink16Description: https://datasheet.ciiva.com/14181/jcrn73-data-e-14181423.pdf?src-supplier=Distrelec; Pricing 1: 1=0.1, 10=0.036, 25=0.0264, 50=0.02, 100=0.0148, 250=0.01124, 500=0.009, 1000=0.00663 (USD); ELV: Compliant; Width: 0.049inch; RoHS: RoHS Compliant; Number of Terminations: 2; ComponentLink2Description: https://datasheet.ciiva.com/11808/0900766b80f80784-11808080.pdf?src-supplier=RSComponents; Power Rating: 125mW; ComponentLink1URL: https://industrial.panasonic.com/cdbs/www-data/pdf/RDA0000/AOA0000C283.pdf; Mount: Surface Mount; Depth: 1.25mm; Case Code (Metric): 2012; ComponentLink12Description: https://datasheet.ciiva.com/24070/aoa0000ce2-24070702.pdf?src-supplier=Mouser; ComponentLink3URL: https://datasheet.ciiva.com/16514/aoa0000ce2-16514021.pdf?src-supplier=Avnet+Asia; ComponentLink2URL: https://datasheet.ciiva.com/11808/0900766b80f80784-11808080.pdf?src-supplier=RSComponents; Height - Seated (Max): 0.028" (0.70mm); Case/Package: 0805; Max Operating Temperature: 155°C; Packaging: Cut Tape (CT); Package Quantity: 5000; Tolerance: ±1%; Voltage Rating: 150V; Min Operating Temperature: -55°C; Resistance: 10K; Composition: Thick Film